# Altium footprint library LimeMicroAltiumLib_pcbLib.PcbLib: 274 footprints (part 8 of 18)
Each footprint in its own frame and in the unit in brackets; x right, y up, seen from the top. Pads: shape width x height; smd on the part's side, far side on the other; paste and mask are expansions set on the pad; w line width, h text height; cw(c..) or ccw(c..) is an arc to the next point about the centre after c.
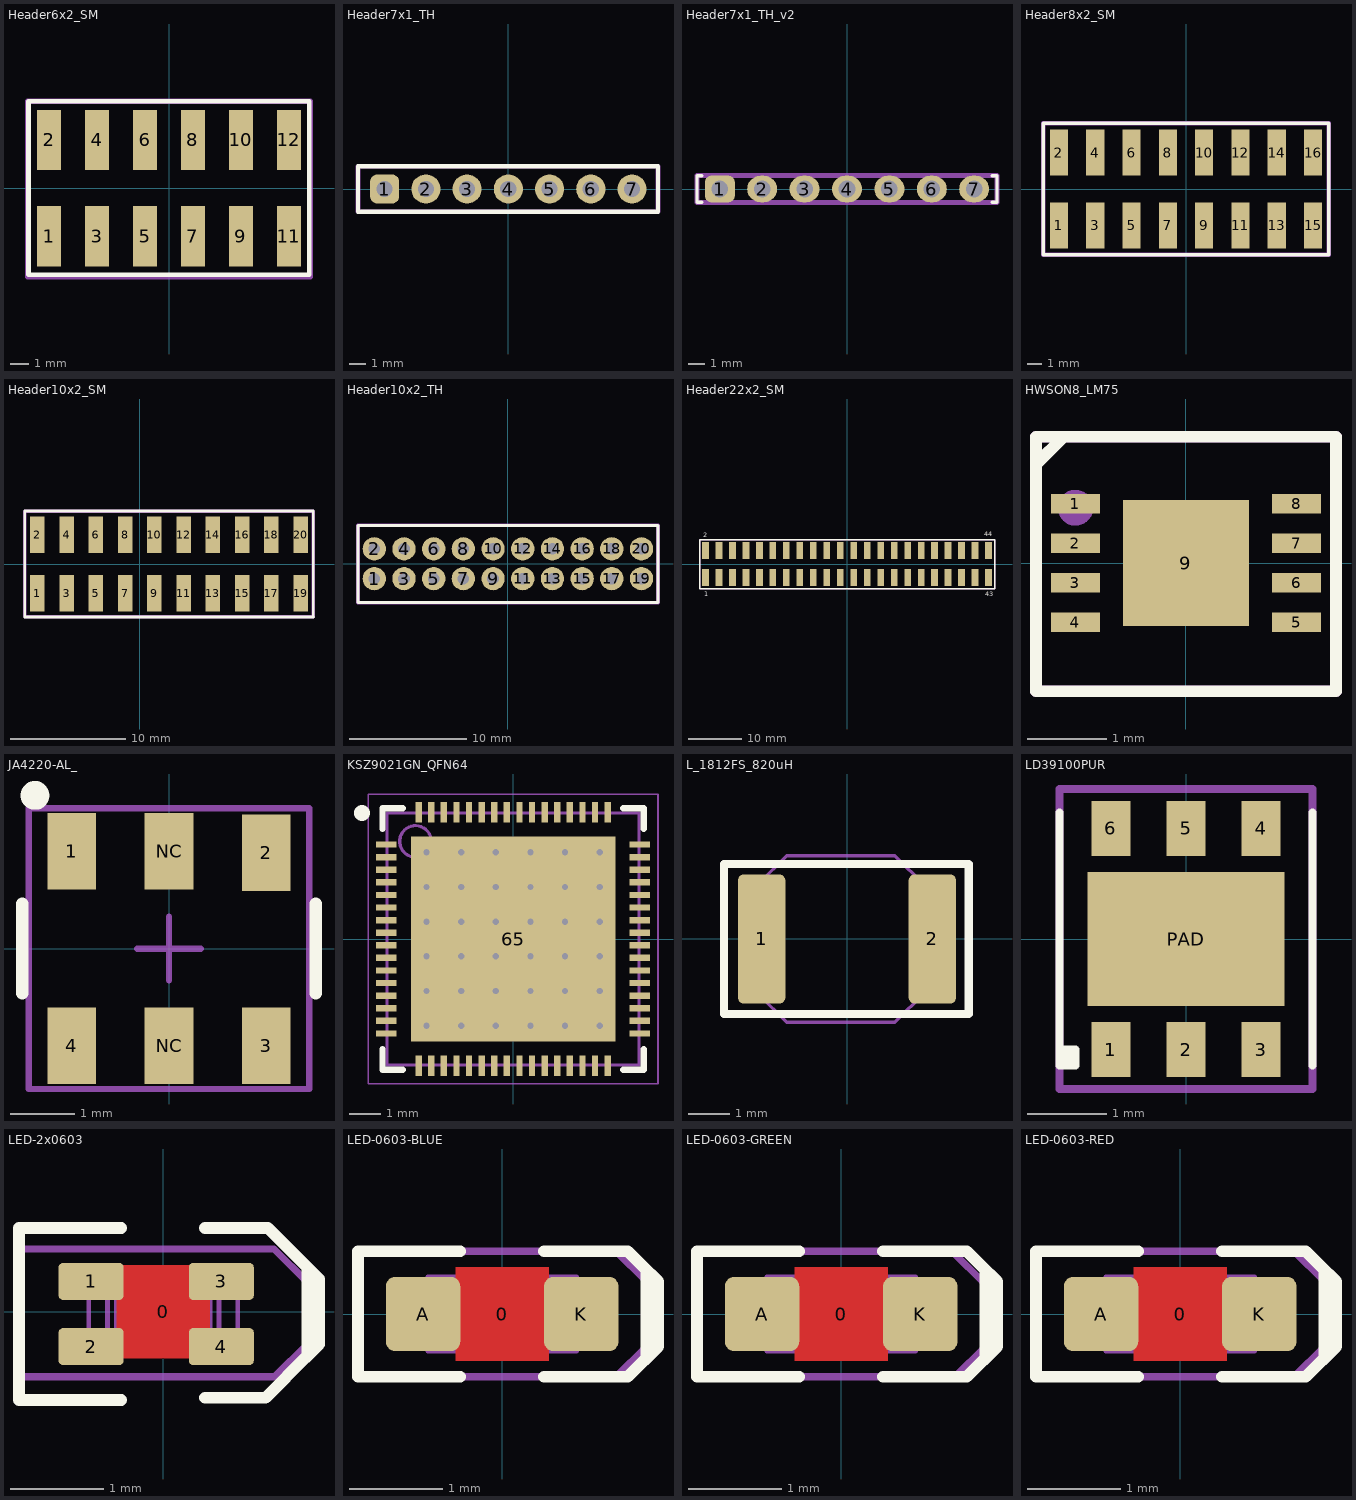
[diagram p7: the footprints below, top view; thin cyan lines are the x and y axes]

## Header6x2_SM [mm]
pads (12):
  rect 1.27x3.2 smd: 1(-6.357,-2.55) 2(-6.357,2.55) 3(-3.814,-2.55) 4(-3.814,2.55) 5(-1.271,-2.55) 6(-1.271,2.55) 7(1.271,-2.55) 8(1.271,2.55) 9(3.814,-2.55) 10(3.814,2.55) 11(6.357,-2.55) 12(6.357,2.55)
Top Overlay:
  lines w0.254: -7.457,-4.6 7.443,-4.6 7.443,4.6 -7.457,4.6 -7.457,-4.6
Mechanical 15:
  lines w0.3: -7.5,-4.7 -7.5,4.6 7.5,4.6 7.5,-4.7 -7.5,-4.7
  text ".Designator" at 0,0 h0.7
3D body "pin_header_a-sl254-dg-g12mp1.stp": height 9.7, standoff -0.04, extent -7.62,-3.75 7.62,3.75

## Header7x1_TH [mm]
pads (7):
  rrect50% 1.8x1.8 hole 1: 1(-7.629,0)
  round 1.8 hole 1: 2(-5.086,0) 3(-2.543,0) 4(0,0) 5(2.543,0) 6(5.086,0) 7(7.629,0)
Top Overlay:
  lines w0.254: -9.271,-1.4 -9.271,1.4 9.229,1.4 9.229,-1.4 -9.271,-1.4
Mechanical 15:
  lines w0.3: -9.271,-1.4 9.229,-1.4 9.229,1.4 -9.271,1.4 -9.271,-1.4
  text ".Designator" at 0,0 h0.7
3D body "PinHeaderMating 1P.stp": height 6.78, standoff -3, extent 6.169,-1.27 9.089,1.27
3D body "PinHeaderMating 1P.stp": height 6.78, standoff -3, extent 3.626,-1.27 6.546,1.27
3D body "PinHeaderMating 1P.stp": height 6.78, standoff -3, extent -1.46,-1.27 1.46,1.27
3D body "PinHeaderMating 1P.stp": height 6.78, standoff -3, extent -4.003,-1.27 -1.083,1.27
3D body "PinHeaderMating 1P.stp": height 6.78, standoff -3, extent -6.546,-1.27 -3.625,1.27
3D body "PinHeaderMating 1P.stp": height 6.78, standoff -3, extent -9.088,-1.27 -6.168,1.27
3D body "PinHeaderMating 1P.stp": height 6.78, standoff -3, extent 1.083,-1.27 4.003,1.27

## Header7x1_TH_v2 [mm]
pads (7):
  rrect50% 1.8x1.6 hole 1: 1(-7.629,0)
  oval 1.8x1.6 hole 1: 2(-5.086,0) 3(-2.543,0) 4(0,0) 5(2.543,0) 6(5.086,0) 7(7.629,0)
Top Overlay:
  lines w0.2: -8.7,-0.8 -9,-0.8 -9,0.8 -8.7,0.8 ; 8.7,-0.8 9,-0.8 9,0.8 8.7,0.8
Mechanical 15:
  lines w0.3: -9,-0.8 9,-0.8 9,0.8 -9,0.8 -9,-0.8
  text ".Designator" at 0,0 h0.7

## Header8x2_SM [mm]
pads (16):
  rect 1.27x3.2 smd: 1(-8.9,-2.55) 2(-8.9,2.55) 3(-6.357,-2.55) 4(-6.357,2.55) 5(-3.814,-2.55) 6(-3.814,2.55) 7(-1.271,-2.55) 8(-1.271,2.55) 9(1.271,-2.55) 10(1.271,2.55) 11(3.814,-2.55) 12(3.814,2.55) 13(6.357,-2.55) 14(6.357,2.55) 15(8.9,-2.55) 16(8.9,2.55)
Top Overlay:
  lines w0.254: -10,-4.6 -10,4.6 10,4.6 10,-4.6 -10,-4.6
Mechanical 15:
  lines w0.3: -10,-4.6 10,-4.6 10,4.6 -10,4.6 -10,-4.6
  text ".Designator" at 0,0 h0.7
3D body "pin_header_a-sl254-dg-g08mp1.stp": height 9.7, standoff -0.04, extent -0.02,-3.95 10.14,3.55
3D body "pin_header_a-sl254-dg-g08mp1.stp": height 9.7, standoff -0.04, extent -10.18,-3.95 -0.02,3.55

## Header10x2_SM [mm] "JTAG"
pads (20):
  rect 1.27x3.2 smd: 1(-8.9,-2.55) 2(-8.9,2.55) 3(-6.357,-2.55) 4(-6.357,2.55) 5(-3.814,-2.55) 6(-3.814,2.55) 7(-1.271,-2.55) 8(-1.271,2.55) 9(1.271,-2.55) 10(1.271,2.55) 11(3.814,-2.55) 12(3.814,2.55) 13(6.357,-2.55) 14(6.357,2.55) 15(8.9,-2.55) 16(8.9,2.55) 17(11.443,-2.55) 18(11.443,2.55) 19(13.986,-2.55) 20(13.986,2.55)
Top Overlay:
  lines w0.254: 15.086,-4.6 15.086,4.6 -10,4.6 -10,-4.6 15.1,-4.6
Mechanical 15:
  lines w0.3: -10,-4.6 15.1,-4.6 15.1,4.6 -10,4.6 -10,-4.6
  text ".Designator" at 0,0 h0.7
3D body "pin_header_a-sl254-dg-g20mp1.stp": height 9.7, standoff -0.04, extent -10.2,-3.75 15.2,3.75

## Header10x2_TH [mm] "JTAG"
pads (20):
  round 2 hole 1: 1(-11.443,-1.271) 2(-11.443,1.271) 3(-8.9,-1.271) 4(-8.9,1.271) 5(-6.357,-1.271) 6(-6.357,1.271) 7(-3.814,-1.271) 8(-3.814,1.271) 9(-1.271,-1.271) 10(-1.271,1.271) 11(1.271,-1.271) 12(1.271,1.271) 13(3.814,-1.271) 14(3.814,1.271) 15(6.357,-1.271) 16(6.357,1.271) 17(8.9,-1.271) 18(8.9,1.271) 19(11.443,-1.271) 20(11.443,1.271)
Top Overlay:
  lines w0.254: -12.843,-3.321 -12.843,3.279 12.857,3.279 12.857,-3.321 -12.843,-3.321
Mechanical 15:
  lines w0.3: -12.843,-3.321 12.857,-3.321 12.857,3.279 -12.843,3.279 -12.843,-3.321
  text ".Designator" at -0.543,-0.021 h0.7
3D body "PinHeaderMating 1P.stp": height 6.78, standoff -3, extent -12.903,0.001 -9.983,2.541
3D body "PinHeaderMating 1P.stp": height 6.78, standoff -3, extent -10.36,0.001 -7.44,2.541
3D body "PinHeaderMating 1P.stp": height 6.78, standoff -3, extent -7.817,0.001 -4.897,2.541
3D body "PinHeaderMating 1P.stp": height 6.78, standoff -3, extent -5.274,0.001 -2.354,2.541
3D body "PinHeaderMating 1P.stp": height 6.78, standoff -3, extent -2.731,0.001 0.189,2.541
3D body "PinHeaderMating 1P.stp": height 6.78, standoff -3, extent -0.188,0.001 2.732,2.541
3D body "PinHeaderMating 1P.stp": height 6.78, standoff -3, extent 2.354,0.001 5.275,2.541
3D body "PinHeaderMating 1P.stp": height 6.78, standoff -3, extent 4.897,0.001 7.817,2.541
3D body "PinHeaderMating 1P.stp": height 6.78, standoff -3, extent 7.44,0.001 10.36,2.541
3D body "PinHeaderMating 1P.stp": height 6.78, standoff -3, extent 9.983,0.001 12.903,2.541
3D body "PinHeaderMating 1P.stp": height 6.78, standoff -3, extent 9.983,-2.541 12.903,-0.001
3D body "PinHeaderMating 1P.stp": height 6.78, standoff -3, extent 7.44,-2.541 10.36,-0.001
3D body "PinHeaderMating 1P.stp": height 6.78, standoff -3, extent 4.897,-2.541 7.817,-0.001
3D body "PinHeaderMating 1P.stp": height 6.78, standoff -3, extent 2.354,-2.541 5.275,-0.001
3D body "PinHeaderMating 1P.stp": height 6.78, standoff -3, extent -0.188,-2.541 2.732,-0.001
3D body "PinHeaderMating 1P.stp": height 6.78, standoff -3, extent -2.731,-2.541 0.189,-0.001
3D body "PinHeaderMating 1P.stp": height 6.78, standoff -3, extent -5.274,-2.541 -2.354,-0.001
3D body "PinHeaderMating 1P.stp": height 6.78, standoff -3, extent -7.817,-2.541 -4.897,-0.001
3D body "PinHeaderMating 1P.stp": height 6.78, standoff -3, extent -10.36,-2.541 -7.44,-0.001
3D body "PinHeaderMating 1P.stp": height 6.78, standoff -3, extent -12.903,-2.541 -9.983,-0.001

## Header22x2_SM [mm]
pads (44):
  rect 1.27x3.2 smd: 1(-26.7,-2.55) 2(-26.7,2.55) 3(-24.157,-2.55) 4(-24.157,2.55) 5(-21.614,-2.55) 6(-21.614,2.55) 7(-19.071,-2.55) 8(-19.071,2.55) 9(-16.529,-2.55) 10(-16.529,2.55) 11(-13.986,-2.55) 12(-13.986,2.55) 13(-11.443,-2.55) 14(-11.443,2.55) 15(-8.9,-2.55) 16(-8.9,2.55) 17(-6.357,-2.55) 18(-6.357,2.55) 19(-3.814,-2.55) 20(-3.814,2.55) 21(-1.271,-2.55) 22(-1.271,2.55) 23(1.271,-2.55) 24(1.271,2.55) 25(3.814,-2.55) 26(3.814,2.55) 27(6.357,-2.55) 28(6.357,2.55) 29(8.9,-2.55) 30(8.9,2.55) 31(11.443,-2.55) 32(11.443,2.55) 33(13.986,-2.55) 34(13.986,2.55) 35(16.529,-2.55) 36(16.529,2.55) 37(19.071,-2.55) 38(19.071,2.55) 39(21.614,-2.55) 40(21.614,2.55) 41(24.157,-2.55) 42(24.157,2.55) 43(26.7,-2.55) 44(26.7,2.55)
Top Overlay:
  lines w0.254: -27.8,-4.6 27.854,-4.6 27.854,4.6 -27.8,4.6 -27.8,-4.6
  text "1" at -26.9,-6.075 h0.9
  text "2" at -27.1,5.125 h0.9
  text "44" at 25.875,5.25 h0.9
  text "43" at 26.125,-6.05 h0.9
Mechanical 15:
  lines w0.3: -27.8,-4.6 -27.8,4.6 27.854,4.6 27.854,-4.6 -27.8,-4.6
  text ".Designator" at -1.296,0.075 h0.7
3D body "pin_header_a-sl254-dg-g20mp1.stp": height 9.7, standoff -0.04, extent -27.9,-3.75 -2.5,3.75
3D body "pin_header_a-sl254-dg-g20mp1.stp": height 9.7, standoff -0.04, extent -2.5,-3.75 22.9,3.75
3D body "pin_header_a-sl254-dg-g20mp1.stp": height 9.7, standoff -0.04, extent 2.586,-3.75 27.986,3.75

## HWSON8_LM75 [mm]
pads (9):
  rect 0.625x0.25 smd: 1(-1.4,0.75) 2(-1.4,0.25) 3(-1.4,-0.25) 4(-1.4,-0.75) 5(1.4,-0.75) 6(1.4,-0.25) 7(1.4,0.25) 8(1.4,0.75)
  rect 1.6x1.6 smd: 9(0,0)
Top Overlay:
  lines w0.15: -1.9,1.25 -1.55,1.6 ; -1.9,-1.625 1.9,-1.625 1.9,1.6 -1.9,1.6 -1.9,-1.625
Mechanical 15:
  circle w0.254: c-1.4,0.7 r0.1
  lines w0.15: -0.3,0 0.3,0 ; 0,-0.3 0,0.3 ; -1.9,-1.625 1.9,-1.625 1.9,1.6 -1.9,1.6 -1.9,-1.625
  text ".Designator" at 0,0 h0.7
3D body "User Library-DFN-8.step": height 0.8, standoff 0, extent -1.51,-1.5 1.51,1.5

## JA4220-AL_ [mm]
pads (6):
  rect 0.76x1.2 smd mask+0.05: 1(-1.52,1.525) 2(1.52,1.5) 3(1.52,-1.525) 4(-1.52,-1.525) NC(0,-1.525) NC(0,1.525)
Top Overlay:
  circle w0.25: c-2.1,2.4 r0.1
  lines w0.2: -2.3,-0.7 -2.3,0.7 ; 2.3,-0.7 2.3,0.7
Mechanical 15:
  circle w0.25: c-1.5,1.6 r0.1
  lines w0.1: -0.5,0 0.5,0 ; 0,-0.5 0,0.5 ; -2.2,-2.2 -2.2,2.2 2.2,2.2 2.2,-2.2 -2.2,-2.2
  text ".Designator" at 0,0 h0.55
3D body "Coilcraft-JA4220-AL.step": height 3.03, standoff -0.02, extent -2.225,-2.095 2.225,2.095

## KSZ9021GN_QFN64 [mm] "QFN, 64-Leads, Body 8,00x8,00mm, Pitch 0,40mm, Thermal Pad 6,50x6,50mm, IPC Medium Density"
height 0.85
pads (65):
  rect 0.65x0.2 smd mask+0.05: 1(-4.025,3) 2(-4.025,2.6) 3(-4.025,2.2) 4(-4.025,1.8) 5(-4.025,1.4) 6(-4.025,1) 7(-4.025,0.6) 8(-4.025,0.2) 9(-4.025,-0.2) 10(-4.025,-0.6) 11(-4.025,-1) 12(-4.025,-1.4) 13(-4.025,-1.8) 14(-4.025,-2.2) 15(-4.025,-2.6) 16(-4.025,-3) 33(4.025,-3) 34(4.025,-2.6) 35(4.025,-2.2) 36(4.025,-1.8) 37(4.025,-1.4) 38(4.025,-1) 39(4.025,-0.6) 40(4.025,-0.2) 41(4.025,0.2) 42(4.025,0.6) 43(4.025,1) 44(4.025,1.4) 45(4.025,1.8) 46(4.025,2.2) 47(4.025,2.6) 48(4.025,3)
  rect 0.2x0.65 smd mask+0.05: 17(-3,-4.025) 18(-2.6,-4.025) 19(-2.2,-4.025) 20(-1.8,-4.025) 21(-1.4,-4.025) 22(-1,-4.025) 23(-0.6,-4.025) 24(-0.2,-4.025) 25(0.2,-4.025) 26(0.6,-4.025) 27(1,-4.025) 28(1.4,-4.025) 29(1.8,-4.025) 30(2.2,-4.025) 31(2.6,-4.025) 32(3,-4.025) 49(3,4.025) 50(2.6,4.025) 51(2.2,4.025) 52(1.8,4.025) 53(1.4,4.025) 54(1,4.025) 55(0.6,4.025) 56(0.2,4.025) 57(-0.2,4.025) 58(-0.6,4.025) 59(-1,4.025) 60(-1.4,4.025) 61(-1.8,4.025) 62(-2.2,4.025) 63(-2.6,4.025) 64(-3,4.025)
  rect 6.5x6.5 smd mask+0.05: 65(0,0)
via 2.75,-2.75 diameter 0.5 hole 0.2
via 1.65,-2.75 diameter 0.5 hole 0.2
via 0.55,-2.75 diameter 0.5 hole 0.2
via -0.55,-2.75 diameter 0.5 hole 0.2
via -1.65,-2.75 diameter 0.5 hole 0.2
via -2.75,-2.75 diameter 0.5 hole 0.2
via 2.75,-1.65 diameter 0.5 hole 0.2
via 1.65,-1.65 diameter 0.5 hole 0.2
via 0.55,-1.65 diameter 0.5 hole 0.2
via -0.55,-1.65 diameter 0.5 hole 0.2
via -1.65,-1.65 diameter 0.5 hole 0.2
via -2.75,-1.65 diameter 0.5 hole 0.2
via 2.75,-0.55 diameter 0.5 hole 0.2
via 1.65,-0.55 diameter 0.5 hole 0.2
via 0.55,-0.55 diameter 0.5 hole 0.2
via -0.55,-0.55 diameter 0.5 hole 0.2
via -1.65,-0.55 diameter 0.5 hole 0.2
via -2.75,-0.55 diameter 0.5 hole 0.2
via 2.75,0.55 diameter 0.5 hole 0.2
via 1.65,0.55 diameter 0.5 hole 0.2
via 0.55,0.55 diameter 0.5 hole 0.2
via -0.55,0.55 diameter 0.5 hole 0.2
via -1.65,0.55 diameter 0.5 hole 0.2
via -2.75,0.55 diameter 0.5 hole 0.2
via 2.75,1.65 diameter 0.5 hole 0.2
via 1.65,1.65 diameter 0.5 hole 0.2
via 0.55,1.65 diameter 0.5 hole 0.2
via -0.55,1.65 diameter 0.5 hole 0.2
via -1.65,1.65 diameter 0.5 hole 0.2
via -2.75,1.65 diameter 0.5 hole 0.2
via 2.75,2.75 diameter 0.5 hole 0.2
via 1.65,2.75 diameter 0.5 hole 0.2
via 0.55,2.75 diameter 0.5 hole 0.2
via -0.55,2.75 diameter 0.5 hole 0.2
via -1.65,2.75 diameter 0.5 hole 0.2
via -2.75,2.75 diameter 0.5 hole 0.2
Top Overlay:
  circle w0.25: c-4.8,4 r0.125
  lines w0.2: -4.15,-3.5 -4.15,-4.15 -3.5,-4.15 ; -4.15,3.5 -4.15,4.15 -3.5,4.15 ; 3.5,-4.15 4.15,-4.15 4.15,-3.5 ; 3.5,4.15 4.15,4.15 4.15,3.5
Mechanical 13:
  circle w0.1: c-3.1,3.1 r0.5
  lines w0.1: -4,-4 4,-4 4,4 -4,4 -4,-4
Mechanical 15:
  lines w0.05: -4.6,-4.6 4.6,-4.6 4.6,4.6 -4.6,4.6 -4.6,-4.6
  lines w0.1: -0.5,0 0.5,0 ; 0,-0.5 0,0.5
  text ".Designator" at 0,0 h0.7
3D body: height 0.85, standoff 0.01, extent -4,-4 4,4

## L_1812FS_820uH [mm] "Chip Resistor, Body 2.0x1.2mm, 0805, IPC Medium Density"
height 0.7
pads (2):
  rrect25% 1.14x3.1 smd: 1(-2.05,0) 2(2.05,0)
Top Overlay:
  lines w0.2: -2.95,-1.8 -2.95,1.8 2.925,1.8 2.925,-1.8 -2.95,-1.8
Mechanical 13:
  lines w0.076: -2.125,-1.325 -2.125,1.325 -1.45,2 1.15,2 1.875,1.275 1.875,-1.275 1.15,-2 -1.45,-2 -2.125,-1.325
Mechanical 15:
  lines w0.1: -2.95,-1.8 2.9,-1.8 2.9,1.8 -2.95,1.8 -2.95,-1.8
  text ".Designator" at 0,0 h0.7
3D body "Inductor Coilcraft LPS4018.STEP": height 1.79, standoff -0.01, extent -2.125,-2 1.875,2

## LD39100PUR [mm]
pads (7):
  rect 0.5x0.7 smd mask+0.05: 1(-0.95,-1.4) 2(0,-1.4) 3(0.95,-1.4) 4(0.95,1.4) 5(0,1.4) 6(-0.95,1.4)
  rect 2.5x1.7 smd mask+0.05: PAD(0,0)
Top Overlay:
  region: -1.6,-1.4 -1.4,-1.4 -1.4,-1.6 -1.6,-1.6
  lines w0.1: -1.6,-1.4 -1.4,-1.4 -1.4,-1.6 -1.6,-1.6 -1.6,1.6 ; 1.6,-1.6 1.6,1.6
Mechanical 15:
  circle w0.2: c-0.9,-1.4 r0.025
  lines w0.1: -0.3,0 0.3,0 ; 0,-0.3 0,0.3 ; -1.6,-1.9 -0.6,-1.9 1.6,-1.9 1.6,-1 1.6,1.9 -1.6,1.9 -1.6,-1.9
  text ".Designator" at 0,0 h0.55
3D body "User Library-dfn6_3x3_rm0_95.step": height 0.8, standoff 0, extent -1.5,-1.55 1.5,1.55

## LED-2x0603 [mm]
height 0.8
pads (5):
  round 0.254 on Mech15: 0(0,0)
  rrect25% 0.7x0.4 smd: 1(-0.775,0.325) 2(-0.775,-0.375) 3(0.625,0.325) 4(0.625,-0.375)
Top Layer:
  pour cut-out: -0.5,0.5 0.5,0.5 0.5,-0.5 -0.5,-0.5
Top Overlay:
  lines w0.127: -0.45,-0.95 -1.55,-0.95 -1.55,0.9 -0.45,0.9 ; 0.45,-0.925 1.1,-0.925 1.55,-0.475 1.55,0.475 1.125,0.9 0.45,0.9 ; 1.5,0.525 1.675,0.35 1.675,-0.35 1.525,-0.5
Mechanical 13:
  lines w0.05: -0.6,-0.4 -0.6,0.399 0.6,0.4 0.6,-0.4 -0.6,-0.399 ; -0.505,-0.398 -0.505,0.398 ; -0.5,-0.4 -0.8,-0.4 -0.8,0.4 -0.5,0.4 ; 0.5,-0.4 0.8,-0.4 0.8,0.4 0.5,0.4 ; 0.505,-0.398 0.505,0.398 ; -0.599,-0.398 0.599,-0.398 0.599,0.398 -0.599,0.398 -0.599,-0.398
Mechanical 15:
  lines w0.076: -1.55,-0.7 1.2,-0.7 1.55,-0.35 1.55,0.316 1.191,0.675 -1.55,0.675 -1.55,-0.7
  text "A" at -1.2,-0.3 h0.7
  text "C" at 0.6,-0.3 h0.7
  text ".Designator" at 0,0 h0.7
3D body: height 0.1, standoff 0, extent -0.1,-0.05 0.1,0.05
3D body "LED 0603 APT1608 GREEN.STEP": height 0.75, standoff 0, extent -0.8,-0.425 0.8,0.375

## LED-0603-BLUE [mm]
height 0.8
pads (3):
  round 0.254 on Mech15: 0(0,0)
  rrect25% 0.8x0.8 smd: A(-0.85,0) K(0.85,0)
Top Layer:
  pour cut-out: -0.5,0.5 0.5,0.5 0.5,-0.5 -0.5,-0.5
Top Overlay:
  lines w0.127: -0.45,-0.675 -1.55,-0.675 -1.55,0.675 -0.45,0.675 ; 0.45,-0.675 1.35,-0.675 1.55,-0.475 1.55,0.475 1.35,0.675 0.45,0.675 ; 1.5,0.525 1.675,0.35 1.675,-0.35 1.525,-0.5
Mechanical 13:
  lines w0.05: -0.6,-0.4 -0.6,0.399 0.6,0.4 0.6,-0.4 -0.6,-0.399 ; -0.505,-0.398 -0.505,0.398 ; -0.5,-0.4 -0.8,-0.4 -0.8,0.4 -0.5,0.4 ; 0.5,-0.4 0.8,-0.4 0.8,0.4 0.5,0.4 ; 0.505,-0.398 0.505,0.398 ; -0.599,-0.398 0.599,-0.398 0.599,0.398 -0.599,0.398 -0.599,-0.398
Mechanical 15:
  lines w0.076: -1.55,-0.675 -1.55,0.675 1.225,0.675 1.55,0.35 1.55,-0.35 1.225,-0.675 -1.55,-0.675
  text ".Designator" at 0,0 h0.7
  text "A" at -1.2,-0.3 h0.7
  text "C" at 0.6,-0.3 h0.7
3D body "LED 0603 APT1608 BLUE.STEP": height 0.75, standoff 0, extent -0.8,-0.4 0.8,0.4

## LED-0603-GREEN [mm]
height 0.8
pads (3):
  round 0.254 on Mech15: 0(0,0)
  rrect25% 0.8x0.8 smd: A(-0.85,0) K(0.85,0)
Top Layer:
  pour cut-out: -0.5,0.5 0.5,0.5 0.5,-0.5 -0.5,-0.5
Top Overlay:
  lines w0.127: -0.45,-0.675 -1.55,-0.675 -1.55,0.675 -0.45,0.675 ; 0.45,-0.675 1.35,-0.675 1.55,-0.475 1.55,0.475 1.35,0.675 0.45,0.675 ; 1.5,0.525 1.675,0.35 1.675,-0.35 1.525,-0.5
Mechanical 13:
  lines w0.05: -0.6,-0.4 -0.6,0.399 0.6,0.4 0.6,-0.4 -0.6,-0.399 ; -0.505,-0.398 -0.505,0.398 ; -0.5,-0.4 -0.8,-0.4 -0.8,0.4 -0.5,0.4 ; 0.5,-0.4 0.8,-0.4 0.8,0.4 0.5,0.4 ; 0.505,-0.398 0.505,0.398 ; -0.599,-0.398 -0.599,0.398 0.599,0.398 0.599,-0.398 -0.599,-0.398
Mechanical 15:
  lines w0.076: -1.55,-0.675 -1.55,0.675 1.191,0.675 1.55,0.316 1.55,-0.35 1.225,-0.675 -1.55,-0.675
  text ".Designator" at 0,0 h0.7
  text "C" at 0.6,-0.3 h0.7
  text "A" at -1.2,-0.3 h0.7
3D body "LED 0603 APT1608 GREEN.STEP": height 0.75, standoff 0, extent -0.8,-0.4 0.8,0.4

## LED-0603-RED [mm]
height 0.8
pads (3):
  round 0.254 on Mech15: 0(0,0)
  rrect25% 0.8x0.8 smd: A(-0.85,0) K(0.85,0)
Top Layer:
  pour cut-out: -0.5,0.5 0.5,0.5 0.5,-0.5 -0.5,-0.5
Top Overlay:
  lines w0.127: -0.45,-0.675 -1.55,-0.675 -1.55,0.675 -0.45,0.675 ; 0.45,-0.675 1.35,-0.675 1.55,-0.475 1.55,0.475 1.35,0.675 0.45,0.675 ; 1.5,0.525 1.675,0.35 1.675,-0.35 1.525,-0.5
Mechanical 13:
  lines w0.05: -0.6,-0.4 -0.6,0.399 0.6,0.4 0.6,-0.4 -0.6,-0.399 ; -0.505,-0.398 -0.505,0.398 ; -0.5,-0.4 -0.8,-0.4 -0.8,0.4 -0.5,0.4 ; 0.5,-0.4 0.8,-0.4 0.8,0.4 0.5,0.4 ; 0.505,-0.398 0.505,0.398 ; -0.599,-0.398 -0.599,0.398 0.599,0.398 0.599,-0.398 -0.599,-0.398
Mechanical 15:
  lines w0.076: -1.55,-0.675 1.225,-0.675 1.55,-0.35 1.55,0.35 1.225,0.675 -1.55,0.675 -1.55,-0.675
  text "A" at -1.2,-0.3 h0.7
  text "C" at 0.6,-0.3 h0.7
  text ".Designator" at 0,0 h0.7
3D body "LED 0603 APT1608 RED.STEP": height 0.75, standoff 0, extent -0.8,-0.4 0.8,0.4